# Altium footprint library Molex FFC - FPC Connectors (Through-Hole).PcbLib: 219 footprints (part 9 of 14)
Each footprint in its own frame and in the unit in brackets; x right, y up, seen from the top. Pads: shape width x height; smd on the part's side, far side on the other; paste and mask are expansions set on the pad; w line width, h text height; cw(c..) or ccw(c..) is an arc to the next point about the centre after c.
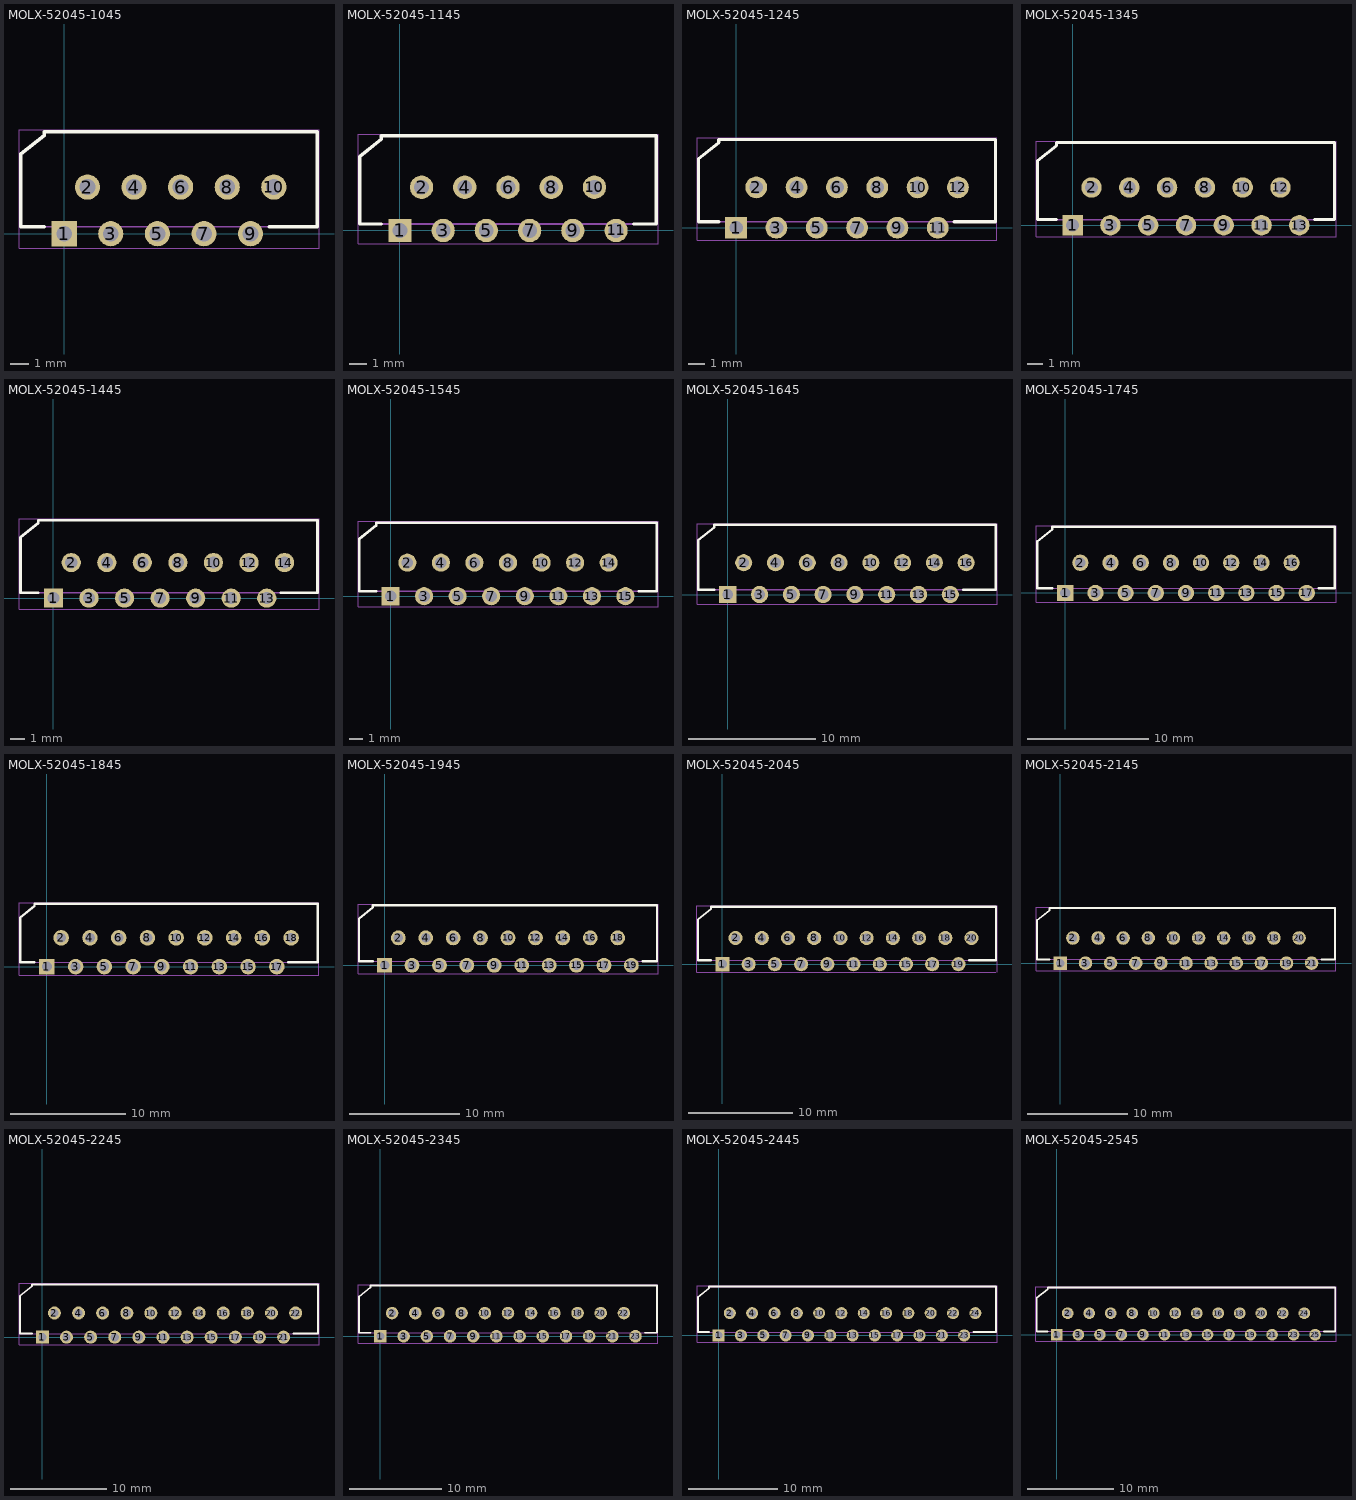
[diagram p8: the footprints below, top view; thin cyan lines are the x and y axes]

## MOLX-52045-1045 [mm] "FFC Connector, 10-Leads, Vertical, Pitch 1.25 mm, Mated Height 8.0 mm, Through Hole"
height 8.012
pads (10):
  rect 1.35x1.35 hole 0.85: 1(0,0)
  round 1.35 hole 0.85: 2(1.25,2.5) 3(2.5,0) 4(3.75,2.5) 5(5,0) 6(6.25,2.5) 7(7.5,0) 8(8.75,2.5) 9(10,0) 10(11.25,2.5)
Top Overlay:
  lines w0.2: -1.075,0.375 -2.325,0.375 -2.325,4.275 -1.075,5.275 -1.075,5.475 13.575,5.475 13.575,0.375 11.007,0.375
Mechanical 13:
  lines w0.1: -2.325,0.375 -2.325,4.275 -1.075,5.275 -1.075,5.475 13.575,5.475 13.575,0.375 -2.325,0.375
Mechanical 15:
  lines w0.05: -2.425,-0.775 -2.425,5.575 13.675,5.575 13.675,-0.775 -2.425,-0.775
3D body "520451045.stp": height 8.01, standoff -3.49, extent -2.325,-0.125 13.575,5.475

## MOLX-52045-1145 [mm] "FFC Connector, 11-Leads, Vertical, Pitch 1.25 mm, Mated Height 8.0 mm, Through Hole"
height 8.012
pads (11):
  rect 1.35x1.35 hole 0.85: 1(0,0)
  round 1.35 hole 0.85: 2(1.25,2.5) 3(2.5,0) 4(3.75,2.5) 5(5,0) 6(6.25,2.5) 7(7.5,0) 8(8.75,2.5) 9(10,0) 10(11.25,2.5) 11(12.5,0)
Top Overlay:
  lines w0.2: -1.075,0.375 -2.325,0.375 -2.325,4.275 -1.075,5.275 -1.075,5.475 14.825,5.475 14.825,0.375 13.507,0.375
Mechanical 13:
  lines w0.1: -2.325,0.375 14.825,0.375 14.825,5.475 -1.075,5.475 -1.075,5.275 -2.325,4.275 -2.325,0.375
Mechanical 15:
  lines w0.05: -2.425,-0.775 14.925,-0.775 14.925,5.575 -2.425,5.575 -2.425,-0.775
3D body "520451145.stp": height 8.01, standoff -3.49, extent -2.325,-0.125 14.825,5.475

## MOLX-52045-1245 [mm] "FFC Connector, 12-Leads, Vertical, Pitch 1.25 mm, Mated Height 8.0 mm, Through Hole"
height 8.012
pads (12):
  rect 1.35x1.35 hole 0.85: 1(0,0)
  round 1.35 hole 0.85: 2(1.25,2.5) 3(2.5,0) 4(3.75,2.5) 5(5,0) 6(6.25,2.5) 7(7.5,0) 8(8.75,2.5) 9(10,0) 10(11.25,2.5) 11(12.5,0) 12(13.75,2.5)
Top Overlay:
  lines w0.2: -1.075,0.375 -2.325,0.375 -2.325,4.275 -1.075,5.275 -1.075,5.475 16.075,5.475 ; 13.507,0.375 16.075,0.375 16.075,5.475
Mechanical 13:
  lines w0.1: -2.325,0.375 -2.325,4.275 -1.075,5.275 -1.075,5.475 16.075,5.475 16.075,0.375 -2.325,0.375
Mechanical 15:
  lines w0.05: -2.425,-0.775 -2.425,5.575 16.175,5.575 16.175,-0.775 -2.425,-0.775
3D body "520451245.stp": height 8.01, standoff -3.49, extent -2.325,-0.125 16.075,5.475

## MOLX-52045-1345 [mm] "FFC Connector, 13-Leads, Vertical, Pitch 1.25 mm, Mated Height 8.0 mm, Through Hole"
height 8.012
pads (13):
  rect 1.35x1.35 hole 0.85: 1(0,0)
  round 1.35 hole 0.85: 2(1.25,2.5) 3(2.5,0) 4(3.75,2.5) 5(5,0) 6(6.25,2.5) 7(7.5,0) 8(8.75,2.5) 9(10,0) 10(11.25,2.5) 11(12.5,0) 12(13.75,2.5) 13(15,0)
Top Overlay:
  lines w0.2: -1.075,0.375 -2.325,0.375 -2.325,4.275 -1.075,5.275 -1.075,5.475 17.325,5.475 17.325,0.375 16.007,0.375
Mechanical 13:
  lines w0.1: -2.325,0.375 -2.325,4.275 -1.075,5.275 -1.075,5.475 17.325,5.475 17.325,0.375 -2.325,0.375
Mechanical 15:
  lines w0.05: -2.425,-0.775 -2.425,5.575 17.425,5.575 17.425,-0.775 -2.425,-0.775
3D body "520451345.stp": height 8.01, standoff -3.49, extent -2.325,-0.125 17.325,5.475

## MOLX-52045-1445 [mm] "FFC Connector, 14-Leads, Vertical, Pitch 1.25 mm, Mated Height 8.0 mm, Through Hole"
height 8.012
pads (14):
  rect 1.35x1.35 hole 0.85: 1(0,0)
  round 1.35 hole 0.85: 2(1.25,2.5) 3(2.5,0) 4(3.75,2.5) 5(5,0) 6(6.25,2.5) 7(7.5,0) 8(8.75,2.5) 9(10,0) 10(11.25,2.5) 11(12.5,0) 12(13.75,2.5) 13(15,0) 14(16.25,2.5)
Top Overlay:
  lines w0.2: -1.075,0.375 -2.325,0.375 -2.325,4.275 -1.075,5.275 -1.075,5.475 18.575,5.475 18.575,0.375 16.007,0.375
Mechanical 13:
  lines w0.1: -2.325,0.375 -2.325,4.275 -1.075,5.275 -1.075,5.475 18.575,5.475 18.575,0.375 -2.325,0.375
Mechanical 15:
  lines w0.05: -2.425,-0.775 -2.425,5.575 18.675,5.575 18.675,-0.775 -2.425,-0.775
3D body "520451445.stp": height 8.01, standoff -3.49, extent -2.325,-0.125 18.575,5.475

## MOLX-52045-1545 [mm] "FFC Connector, 15-Leads, Vertical, Pitch 1.25 mm, Mated Height 8.0 mm, Through Hole"
height 8.012
pads (15):
  rect 1.35x1.35 hole 0.85: 1(0,0)
  round 1.35 hole 0.85: 2(1.25,2.5) 3(2.5,0) 4(3.75,2.5) 5(5,0) 6(6.25,2.5) 7(7.5,0) 8(8.75,2.5) 9(10,0) 10(11.25,2.5) 11(12.5,0) 12(13.75,2.5) 13(15,0) 14(16.25,2.5) 15(17.5,0)
Top Overlay:
  lines w0.2: -1.075,0.375 -2.325,0.375 -2.325,4.275 -1.075,5.275 -1.075,5.475 19.825,5.475 19.825,0.375 18.507,0.375
Mechanical 13:
  lines w0.1: -2.325,0.375 -2.325,4.275 -1.075,5.275 -1.075,5.475 19.825,5.475 19.825,0.375 -2.325,0.375
Mechanical 15:
  lines w0.05: -2.425,-0.775 -2.425,5.575 19.925,5.575 19.925,-0.775 -2.425,-0.775
3D body "520451545.stp": height 8.01, standoff -3.49, extent -2.325,-0.125 19.825,5.475

## MOLX-52045-1645 [mm] "FFC Connector, 16-Leads, Vertical, Pitch 1.25 mm, Mated Height 8.0 mm, Through Hole"
height 8.012
pads (16):
  rect 1.35x1.35 hole 0.85: 1(0,0)
  round 1.35 hole 0.85: 2(1.25,2.5) 3(2.5,0) 4(3.75,2.5) 5(5,0) 6(6.25,2.5) 7(7.5,0) 8(8.75,2.5) 9(10,0) 10(11.25,2.5) 11(12.5,0) 12(13.75,2.5) 13(15,0) 14(16.25,2.5) 15(17.5,0) 16(18.75,2.5)
Top Overlay:
  lines w0.2: -1.075,0.375 -2.325,0.375 -2.325,4.275 -1.075,5.275 -1.075,5.475 21.075,5.475 21.075,0.375 18.507,0.375
Mechanical 13:
  lines w0.1: -2.325,0.375 -2.325,4.275 -1.075,5.275 -1.075,5.475 21.075,5.475 21.075,0.375 -2.325,0.375
Mechanical 15:
  lines w0.05: -2.425,-0.775 -2.425,5.575 21.175,5.575 21.175,-0.775 -2.425,-0.775
3D body "520451645.stp": height 8.01, standoff -3.49, extent -2.325,-0.125 21.075,5.475

## MOLX-52045-1745 [mm] "FFC Connector, 17-Leads, Vertical, Pitch 1.25 mm, Mated Height 8.0 mm, Through Hole"
height 8.012
pads (17):
  rect 1.35x1.35 hole 0.85: 1(0,0)
  round 1.35 hole 0.85: 2(1.25,2.5) 3(2.5,0) 4(3.75,2.5) 5(5,0) 6(6.25,2.5) 7(7.5,0) 8(8.75,2.5) 9(10,0) 10(11.25,2.5) 11(12.5,0) 12(13.75,2.5) 13(15,0) 14(16.25,2.5) 15(17.5,0) 16(18.75,2.5) 17(20,0)
Top Overlay:
  lines w0.2: -1.075,0.375 -2.325,0.375 -2.325,4.275 -1.075,5.275 -1.075,5.475 22.325,5.475 22.325,0.375 21.007,0.375
Mechanical 13:
  lines w0.1: -2.325,0.375 -2.325,4.275 -1.075,5.275 -1.075,5.475 22.325,5.475 22.325,0.375 -2.325,0.375
Mechanical 15:
  lines w0.05: -2.425,-0.775 -2.425,5.575 22.425,5.575 22.425,-0.775 -2.425,-0.775
3D body "520451745.stp": height 8.01, standoff -3.49, extent -2.325,-0.125 22.325,5.475

## MOLX-52045-1845 [mm] "FFC Connector, 18-Leads, Vertical, Pitch 1.25 mm, Mated Height 8.0 mm, Through Hole"
height 8.012
pads (18):
  rect 1.35x1.35 hole 0.85: 1(0,0)
  round 1.35 hole 0.85: 2(1.25,2.5) 3(2.5,0) 4(3.75,2.5) 5(5,0) 6(6.25,2.5) 7(7.5,0) 8(8.75,2.5) 9(10,0) 10(11.25,2.5) 11(12.5,0) 12(13.75,2.5) 13(15,0) 14(16.25,2.5) 15(17.5,0) 16(18.75,2.5) 17(20,0) 18(21.25,2.5)
Top Overlay:
  lines w0.2: -1.075,0.375 -2.325,0.375 -2.325,4.275 -1.075,5.275 -1.075,5.475 23.575,5.475 23.575,0.375 21.007,0.375
Mechanical 13:
  lines w0.1: -2.325,0.375 -2.325,4.275 -1.075,5.275 -1.075,5.475 23.575,5.475 23.575,0.375 -2.325,0.375
Mechanical 15:
  lines w0.05: -2.425,-0.775 -2.425,5.575 23.675,5.575 23.675,-0.775 -2.425,-0.775
3D body "520451845.stp": height 8.01, standoff -3.49, extent -2.325,-0.125 23.575,5.475

## MOLX-52045-1945 [mm] "FFC Connector, 19-Leads, Vertical, Pitch 1.25 mm, Mated Height 8.0 mm, Through Hole"
height 8.012
pads (19):
  rect 1.35x1.35 hole 0.85: 1(0,0)
  round 1.35 hole 0.85: 2(1.25,2.5) 3(2.5,0) 4(3.75,2.5) 5(5,0) 6(6.25,2.5) 7(7.5,0) 8(8.75,2.5) 9(10,0) 10(11.25,2.5) 11(12.5,0) 12(13.75,2.5) 13(15,0) 14(16.25,2.5) 15(17.5,0) 16(18.75,2.5) 17(20,0) 18(21.25,2.5) 19(22.5,0)
Top Overlay:
  lines w0.2: -1.075,0.375 -2.325,0.375 -2.325,4.275 -1.075,5.275 -1.075,5.475 24.825,5.475 24.825,0.375 23.507,0.375
Mechanical 13:
  lines w0.1: -2.325,0.375 -2.325,4.275 -1.075,5.275 -1.075,5.475 24.825,5.475 24.825,0.375 -2.325,0.375
Mechanical 15:
  lines w0.05: -2.425,-0.775 -2.425,5.575 24.925,5.575 24.925,-0.775 -2.425,-0.775
3D body "520451945.stp": height 8.01, standoff -3.49, extent -2.325,-0.125 24.825,5.475

## MOLX-52045-2045 [mm] "FFC Connector, 20-Leads, Vertical, Pitch 1.25 mm, Mated Height 8.0 mm, Through Hole"
height 8.012
pads (20):
  rect 1.35x1.35 hole 0.85: 1(0,0)
  round 1.35 hole 0.85: 2(1.25,2.5) 3(2.5,0) 4(3.75,2.5) 5(5,0) 6(6.25,2.5) 7(7.5,0) 8(8.75,2.5) 9(10,0) 10(11.25,2.5) 11(12.5,0) 12(13.75,2.5) 13(15,0) 14(16.25,2.5) 15(17.5,0) 16(18.75,2.5) 17(20,0) 18(21.25,2.5) 19(22.5,0) 20(23.75,2.5)
Top Overlay:
  lines w0.2: -1.075,0.375 -2.325,0.375 -2.325,4.275 -1.075,5.275 -1.075,5.475 26.075,5.475 26.075,0.375 23.507,0.375
Mechanical 13:
  lines w0.1: -2.325,0.375 -2.325,4.275 -1.075,5.275 -1.075,5.475 26.075,5.475 26.075,0.375 -2.325,0.375
Mechanical 15:
  lines w0.05: 26.075,-0.775 -2.425,-0.775 -2.425,5.575 26.175,5.575 26.175,-0.775
3D body "520452045.stp": height 8.01, standoff -3.49, extent -2.325,-0.125 26.075,5.475

## MOLX-52045-2145 [mm] "FFC Connector, 21-Leads, Vertical, Pitch 1.25 mm, Mated Height 8.0 mm, Through Hole"
height 8.012
pads (21):
  rect 1.35x1.35 hole 0.85: 1(0,0)
  round 1.35 hole 0.85: 2(1.25,2.5) 3(2.5,0) 4(3.75,2.5) 5(5,0) 6(6.25,2.5) 7(7.5,0) 8(8.75,2.5) 9(10,0) 10(11.25,2.5) 11(12.5,0) 12(13.75,2.5) 13(15,0) 14(16.25,2.5) 15(17.5,0) 16(18.75,2.5) 17(20,0) 18(21.25,2.5) 19(22.5,0) 20(23.75,2.5) 21(25,0)
Top Overlay:
  lines w0.2: -1.075,0.375 -2.325,0.375 -2.325,4.275 -1.075,5.275 -1.075,5.475 27.325,5.475 27.325,0.375 26.007,0.375
Mechanical 13:
  lines w0.1: -2.325,0.375 -2.325,4.275 -1.075,5.275 -1.075,5.475 27.325,5.475 27.325,0.375 -2.325,0.375
Mechanical 15:
  lines w0.05: -2.425,-0.775 -2.425,5.575 27.425,5.575 27.425,-0.775 -2.425,-0.775
3D body "520452145.stp": height 8.01, standoff -3.49, extent -2.325,-0.125 27.325,5.475

## MOLX-52045-2245 [mm] "FFC Connector, 22-Leads, Vertical, Pitch 1.25 mm, Mated Height 8.0 mm, Through Hole"
height 8.012
pads (22):
  rect 1.35x1.35 hole 0.85: 1(0,0)
  round 1.35 hole 0.85: 2(1.25,2.5) 3(2.5,0) 4(3.75,2.5) 5(5,0) 6(6.25,2.5) 7(7.5,0) 8(8.75,2.5) 9(10,0) 10(11.25,2.5) 11(12.5,0) 12(13.75,2.5) 13(15,0) 14(16.25,2.5) 15(17.5,0) 16(18.75,2.5) 17(20,0) 18(21.25,2.5) 19(22.5,0) 20(23.75,2.5) 21(25,0) 22(26.25,2.5)
Top Overlay:
  lines w0.2: -1.075,0.375 -2.325,0.375 -2.325,4.275 -1.075,5.275 -1.075,5.475 28.575,5.475 28.575,0.375 26.007,0.375
Mechanical 13:
  lines w0.1: -2.325,0.375 28.575,0.375 28.575,5.475 -1.075,5.475 -1.075,5.275 -2.325,4.275 -2.325,0.375
Mechanical 15:
  lines w0.05: -2.425,-0.775 28.675,-0.775 28.675,5.575 -2.425,5.575 -2.425,-0.775
3D body "520452245.stp": height 8.01, standoff -3.49, extent -2.325,-0.125 28.575,5.475

## MOLX-52045-2345 [mm] "FFC Connector, 23-Leads, Vertical, Pitch 1.25 mm, Mated Height 8.0 mm, Through Hole"
height 8.012
pads (23):
  rect 1.35x1.35 hole 0.85: 1(0,0)
  round 1.35 hole 0.85: 2(1.25,2.5) 3(2.5,0) 4(3.75,2.5) 5(5,0) 6(6.25,2.5) 7(7.5,0) 8(8.75,2.5) 9(10,0) 10(11.25,2.5) 11(12.5,0) 12(13.75,2.5) 13(15,0) 14(16.25,2.5) 15(17.5,0) 16(18.75,2.5) 17(20,0) 18(21.25,2.5) 19(22.5,0) 20(23.75,2.5) 21(25,0) 22(26.25,2.5) 23(27.5,0)
Top Overlay:
  lines w0.2: -1.075,0.375 -2.325,0.375 -2.325,4.275 -1.075,5.275 -1.075,5.475 29.825,5.475 29.825,0.375 28.507,0.375
Mechanical 13:
  lines w0.1: -2.325,0.375 -2.325,4.275 -1.075,5.275 -1.075,5.475 29.825,5.475 29.825,0.375 -2.325,0.375
Mechanical 15:
  lines w0.05: -2.425,-0.775 -2.425,5.575 29.925,5.575 29.925,-0.775 -2.425,-0.775
3D body "520452345.stp": height 8.01, standoff -3.49, extent -2.325,-0.125 29.825,5.475

## MOLX-52045-2445 [mm] "FFC Connector, 24-Leads, Vertical, Pitch 1.25 mm, Mated Height 8.0 mm, Through Hole"
height 8.012
pads (24):
  rect 1.35x1.35 hole 0.85: 1(0,0)
  round 1.35 hole 0.85: 2(1.25,2.5) 3(2.5,0) 4(3.75,2.5) 5(5,0) 6(6.25,2.5) 7(7.5,0) 8(8.75,2.5) 9(10,0) 10(11.25,2.5) 11(12.5,0) 12(13.75,2.5) 13(15,0) 14(16.25,2.5) 15(17.5,0) 16(18.75,2.5) 17(20,0) 18(21.25,2.5) 19(22.5,0) 20(23.75,2.5) 21(25,0) 22(26.25,2.5) 23(27.5,0) 24(28.75,2.5)
Top Overlay:
  lines w0.2: -1.075,0.375 -2.325,0.375 -2.325,4.275 -1.075,5.275 -1.075,5.475 31.075,5.475 31.075,0.375 28.507,0.375
Mechanical 13:
  lines w0.1: -2.325,0.375 -2.325,4.275 -1.075,5.275 -1.075,5.475 31.075,5.475 31.075,0.375 -2.325,0.375
Mechanical 15:
  lines w0.05: -2.425,-0.775 -2.425,5.575 31.175,5.575 31.175,-0.775 -2.425,-0.775
3D body "520452445.stp": height 8.01, standoff -3.49, extent -2.325,-0.125 31.075,5.475

## MOLX-52045-2545 [mm] "FFC Connector, 25-Leads, Vertical, Pitch 1.25 mm, Mated Height 8.0 mm, Through Hole"
height 8.012
pads (25):
  rect 1.35x1.35 hole 0.85: 1(0,0)
  round 1.35 hole 0.85: 2(1.25,2.5) 3(2.5,0) 4(3.75,2.5) 5(5,0) 6(6.25,2.5) 7(7.5,0) 8(8.75,2.5) 9(10,0) 10(11.25,2.5) 11(12.5,0) 12(13.75,2.5) 13(15,0) 14(16.25,2.5) 15(17.5,0) 16(18.75,2.5) 17(20,0) 18(21.25,2.5) 19(22.5,0) 20(23.75,2.5) 21(25,0) 22(26.25,2.5) 23(27.5,0) 24(28.75,2.5) 25(30,0)
Top Overlay:
  lines w0.2: -1.075,0.375 -2.325,0.375 -2.325,4.275 -1.075,5.275 -1.075,5.475 32.325,5.475 32.325,0.375 31.007,0.375
Mechanical 13:
  lines w0.1: -2.325,0.375 -2.325,4.275 -1.075,5.275 -1.075,5.475 32.325,5.475 32.325,0.375 -2.325,0.375
Mechanical 15:
  lines w0.05: -2.425,-0.775 -2.425,5.575 32.425,5.575 32.425,-0.775 -2.425,-0.775
3D body "520452545.stp": height 8.01, standoff -3.49, extent -2.325,-0.125 32.325,5.475